# Altium footprint library MainFPs.PcbLib: 206 footprints (part 5 of 13)
Each footprint in its own frame and in the unit in brackets; x right, y up, seen from the top. Pads: shape width x height; smd on the part's side, far side on the other; paste and mask are expansions set on the pad; w line width, h text height; cw(c..) or ccw(c..) is an arc to the next point about the centre after c.
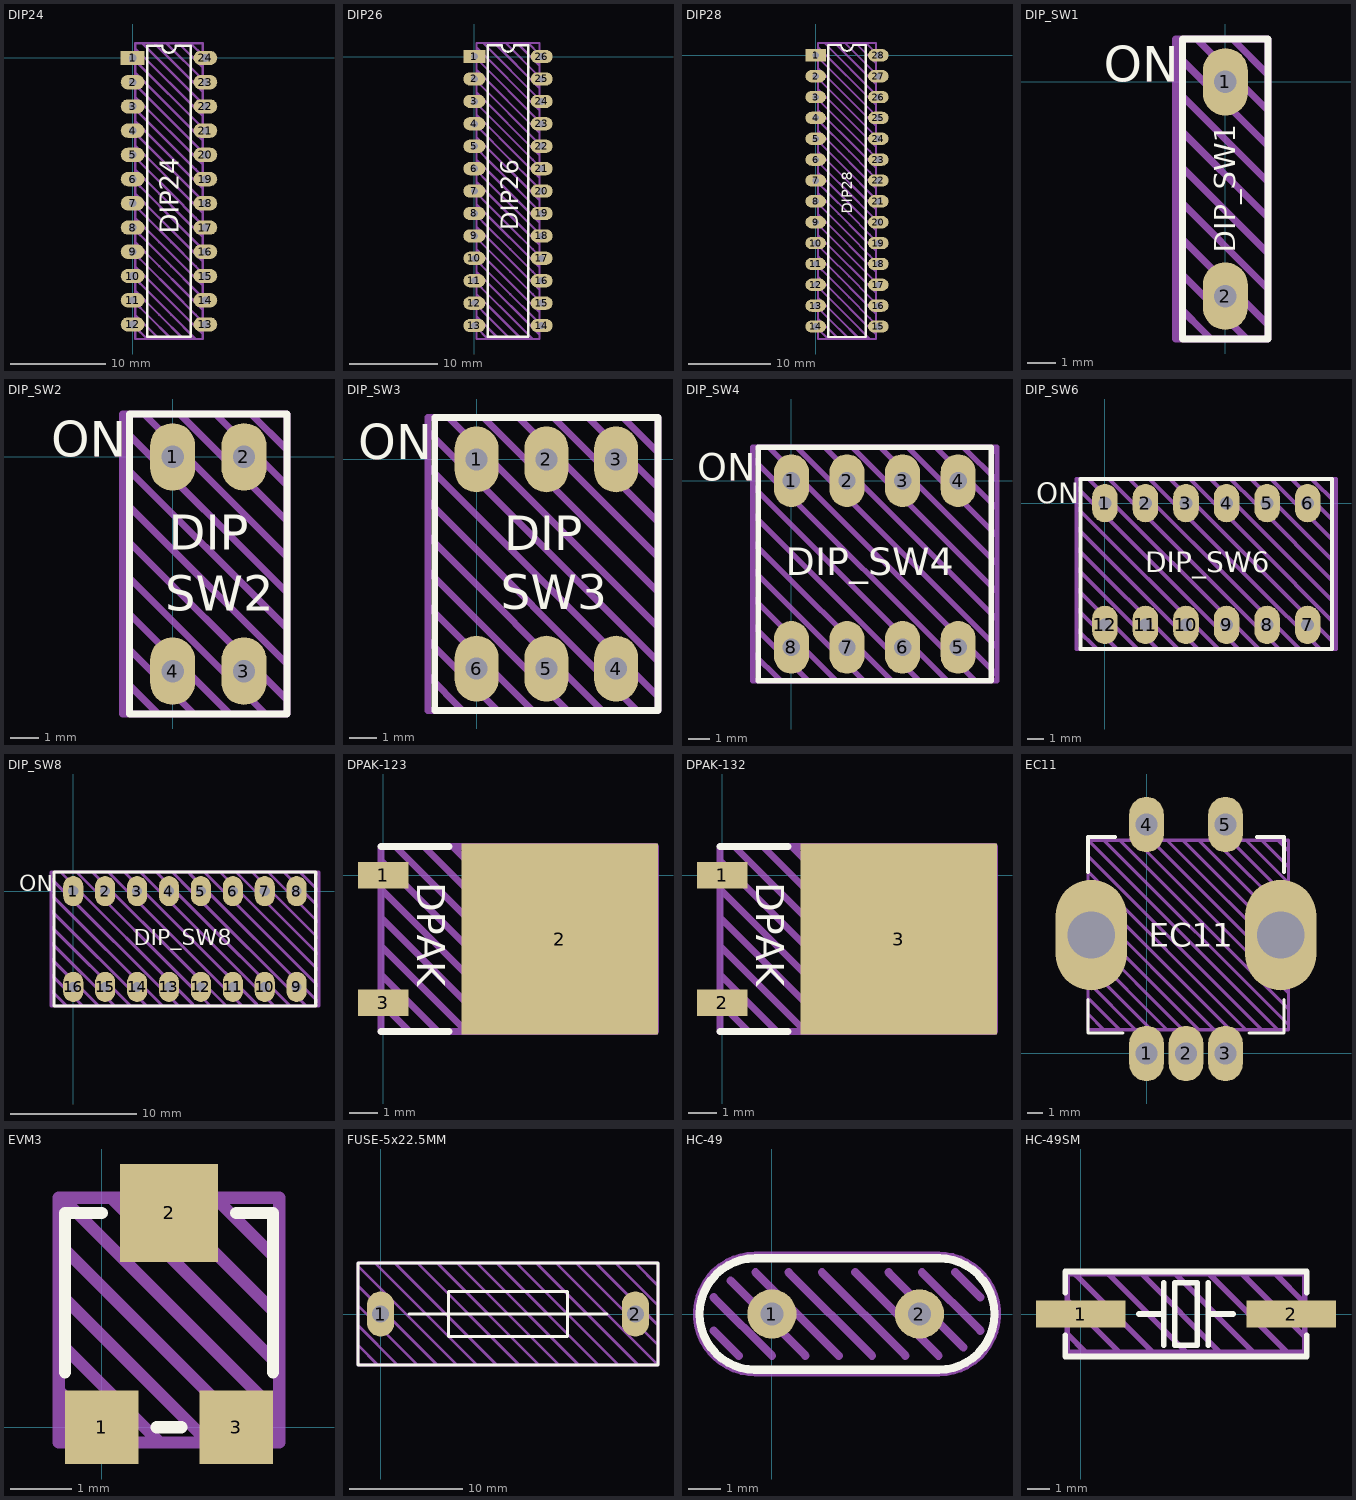
[diagram p4: the footprints below, top view; thin cyan lines are the x and y axes]

## DIP24 [mm]
pads (24):
  rect 2.5x1.5 hole 0.8: 1(0,0)
  oval 2.5x1.5 hole 0.8: 2(0,-2.54) 3(0,-5.08) 4(0,-7.62) 5(0,-10.16) 6(0,-12.7) 7(0,-15.24) 8(0,-17.78) 9(0,-20.32) 10(0,-22.86) 11(0,-25.4) 12(0,-27.94) 13(7.62,-27.94) 14(7.62,-25.4) 15(7.62,-22.86) 16(7.62,-20.32) 17(7.62,-17.78) 18(7.62,-15.24) 19(7.62,-12.7) 20(7.62,-10.16) 21(7.62,-7.62) 22(7.62,-5.08) 23(7.62,-2.54) 24(7.62,0)
Top Overlay:
  lines w0.25: 3.048,1.27 1.524,1.27 1.524,-29.21 6.096,-29.21 6.096,1.27 4.572,1.27 ; 3.092,1.27 ccw(c3.81,1.27) 4.528,1.27
  text "DIP24" at 4.826,-18.415 h2
Draw:
  lines w0.25: 0.254,-28.194 1.524,-29.464 ; 0.254,-26.924 2.794,-29.464 ; 0.254,-25.654 1.524,-26.924 4.064,-29.464 ; 0.254,-24.384 2.794,-26.924 5.334,-29.464 ; 0.254,-23.114 1.524,-24.384 4.064,-26.924 6.604,-29.464 ; 0.254,-21.844 2.794,-24.384 5.334,-26.924 7.366,-28.956 ; 0.254,-20.574 1.524,-21.844 4.064,-24.384 6.604,-26.924 7.366,-27.686 ; 0.254,-19.304 2.794,-21.844 5.334,-24.384 7.366,-26.416 ; 0.254,-18.034 1.524,-19.304 4.064,-21.844 6.604,-24.384 7.366,-25.146 ; 0.254,-16.764 2.794,-19.304 5.334,-21.844 7.366,-23.876 ; 0.254,-15.494 1.524,-16.764 4.064,-19.304 6.604,-21.844 7.366,-22.606 ; 0.254,-14.224 2.794,-16.764 5.334,-19.304 7.366,-21.336 ; 0.254,-12.954 1.524,-14.224 4.064,-16.764 6.604,-19.304 7.366,-20.066 ; 0.254,-11.684 2.794,-14.224 5.334,-16.764 7.366,-18.796 ; 0.254,-10.414 1.524,-11.684 ; 0.254,-9.144 2.794,-11.684 ; 0.254,-7.874 4.064,-11.684 6.604,-14.224 7.366,-14.986 ; 0.254,-6.604 5.334,-11.684 7.366,-13.716 ; 0.254,-5.334 6.604,-11.684 7.366,-12.446 ; 0.254,-4.064 7.366,-11.176 ; 0.254,-2.794 7.366,-9.906 ; 0.254,-1.524 7.366,-8.636 ; 0.254,-0.254 7.366,-7.366 ; 0.254,1.016 7.366,-6.096 ; 1.016,1.524 7.366,-4.826 ; 2.286,1.524 7.366,-3.556 ; 3.556,1.524 7.366,-2.286 ; 4.826,1.524 7.366,-1.016 ; 6.096,1.524 7.366,0.254 ; 7.366,-17.526 6.604,-16.764 4.064,-14.224 ; 7.366,-16.256 5.334,-14.224 ; 2.794,-11.684 5.334,-14.224 ; 2.794,-11.684 5.334,-14.224 ; 4.064,-14.224 1.27,-11.43 4.064,-14.224 ; 0.254,-29.464 7.366,-29.464 7.366,1.524 0.254,1.524 0.254,-29.464
Info:
  text "'.Comment'" at -0.381,-30.861 h1
3D body: height 0.38, standoff -3, extent 7.493,-20.574 7.747,-20.066
3D body: height 2.09, standoff 0.31, extent 7.112,-20.82 7.747,-19.82
3D body: height 0.38, standoff -3, extent 7.493,-23.114 7.747,-22.606
3D body: height 2.09, standoff 0.31, extent 7.112,-23.36 7.747,-22.36
3D body: height 0.38, standoff -3, extent -0.127,-23.114 0.127,-22.606
3D body: height 2.09, standoff 0.31, extent -0.127,-23.36 0.508,-22.36
3D body: height 0.38, standoff -3, extent -0.127,-20.574 0.127,-20.066
3D body: height 2.09, standoff 0.31, extent -0.127,-20.82 0.508,-19.82
3D body: height 0.38, standoff -3, extent 7.493,-25.654 7.747,-25.146
3D body: height 2.09, standoff 0.31, extent 7.112,-25.9 7.747,-24.9
3D body: height 0.38, standoff -3, extent 7.493,-28.194 7.747,-27.686
3D body: height 2.09, standoff 0.31, extent 7.112,-28.44 7.747,-27.44
3D body: height 0.38, standoff -3, extent -0.127,-28.194 0.127,-27.686
3D body: height 2.09, standoff 0.31, extent -0.127,-28.44 0.508,-27.44
3D body: height 0.38, standoff -3, extent -0.127,-25.654 0.127,-25.146
3D body: height 2.09, standoff 0.31, extent -0.127,-25.9 0.508,-24.9
3D body: height 0.38, standoff -3, extent 7.493,-10.414 7.747,-9.906
3D body: height 2.09, standoff 0.31, extent 7.112,-10.66 7.747,-9.66
3D body: height 0.38, standoff -3, extent 7.493,-12.954 7.747,-12.446
3D body: height 2.09, standoff 0.31, extent 7.112,-13.2 7.747,-12.2
3D body: height 0.38, standoff -3, extent -0.127,-12.954 0.127,-12.446
3D body: height 2.09, standoff 0.31, extent -0.127,-13.2 0.508,-12.2
3D body: height 0.38, standoff -3, extent -0.127,-10.414 0.127,-9.906
3D body: height 2.09, standoff 0.31, extent -0.127,-10.66 0.508,-9.66
3D body: height 0.38, standoff -3, extent 7.493,-15.494 7.747,-14.986
3D body: height 2.09, standoff 0.31, extent 7.112,-15.74 7.747,-14.74
3D body: height 0.38, standoff -3, extent 7.493,-18.034 7.747,-17.526
3D body: height 2.09, standoff 0.31, extent 7.112,-18.28 7.747,-17.28
3D body: height 0.38, standoff -3, extent -0.127,-18.034 0.127,-17.526
3D body: height 2.09, standoff 0.31, extent -0.127,-18.28 0.508,-17.28
3D body: height 0.38, standoff -3, extent -0.127,-15.494 0.127,-14.986
3D body: height 2.09, standoff 0.31, extent -0.127,-15.74 0.508,-14.74
3D body: height 0.38, standoff -3, extent 7.493,-0.254 7.747,0.254
3D body: height 2.09, standoff 0.31, extent 7.112,-0.5 7.747,0.5
3D body: height 0.38, standoff -3, extent 7.493,-2.794 7.747,-2.286
3D body: height 2.09, standoff 0.31, extent 7.112,-3.04 7.747,-2.04
3D body: height 0.38, standoff -3, extent -0.127,-2.794 0.127,-2.286
3D body: height 2.09, standoff 0.31, extent -0.127,-3.04 0.508,-2.04
3D body: height 0.38, standoff -3, extent -0.127,-0.254 0.127,0.254
3D body: height 2.09, standoff 0.31, extent -0.127,-0.5 0.508,0.5
3D body: height 0.38, standoff -3, extent 7.493,-5.334 7.747,-4.826
3D body: height 2.09, standoff 0.31, extent 7.112,-5.58 7.747,-4.58
3D body: height 0.38, standoff -3, extent 7.493,-7.874 7.747,-7.366
3D body: height 2.09, standoff 0.31, extent 7.112,-8.12 7.747,-7.12
3D body: height 0.38, standoff -3, extent -0.127,-7.874 0.127,-7.366
3D body: height 2.09, standoff 0.31, extent -0.127,-8.12 0.508,-7.12
3D body: height 0.38, standoff -3, extent -0.127,-5.334 0.127,-4.826
3D body: height 2.09, standoff 0.31, extent -0.127,-5.58 0.508,-4.58
3D body: height 3, standoff 2, extent 0.508,-29.21 7.112,1.27
3D body: height 2.03, standoff 0.25, extent 0.508,-29.21 7.112,1.27

## DIP26 [mm]
pads (26):
  rect 2.5x1.5 hole 0.8: 1(0,0)
  oval 2.5x1.5 hole 0.8: 2(0,-2.54) 3(0,-5.08) 4(0,-7.62) 5(0,-10.16) 6(0,-12.7) 7(0,-15.24) 8(0,-17.78) 9(0,-20.32) 10(0,-22.86) 11(0,-25.4) 12(0,-27.94) 13(0,-30.48) 14(7.62,-30.48) 15(7.62,-27.94) 16(7.62,-25.4) 17(7.62,-22.86) 18(7.62,-20.32) 19(7.62,-17.78) 20(7.62,-15.24) 21(7.62,-12.7) 22(7.62,-10.16) 23(7.62,-7.62) 24(7.62,-5.08) 25(7.62,-2.54) 26(7.62,0)
Top Overlay:
  lines w0.25: 3.048,1.27 1.524,1.27 1.524,-31.75 6.096,-31.75 6.096,1.27 4.572,1.27 ; 3.092,1.27 ccw(c3.81,1.27) 4.528,1.27
  text "DIP26" at 4.953,-19.685 h2
Draw:
  lines w0.25: 0.254,-30.734 1.524,-32.004 ; 0.254,-29.464 2.794,-32.004 ; 0.254,-28.194 1.524,-29.464 4.064,-32.004 ; 0.254,-26.924 2.794,-29.464 5.334,-32.004 ; 0.254,-25.654 1.524,-26.924 4.064,-29.464 6.604,-32.004 ; 0.254,-24.384 2.794,-26.924 5.334,-29.464 7.366,-31.496 ; 0.254,-23.114 1.524,-24.384 4.064,-26.924 6.604,-29.464 7.366,-30.226 ; 0.254,-21.844 2.794,-24.384 5.334,-26.924 7.366,-28.956 ; 0.254,-20.574 1.524,-21.844 4.064,-24.384 6.604,-26.924 7.366,-27.686 ; 0.254,-19.304 2.794,-21.844 5.334,-24.384 7.366,-26.416 ; 0.254,-18.034 1.524,-19.304 4.064,-21.844 6.604,-24.384 7.366,-25.146 ; 0.254,-16.764 2.794,-19.304 5.334,-21.844 7.366,-23.876 ; 0.254,-15.494 1.524,-16.764 4.064,-19.304 6.604,-21.844 7.366,-22.606 ; 0.254,-14.224 2.794,-16.764 5.334,-19.304 7.366,-21.336 ; 0.254,-12.954 1.524,-14.224 4.064,-16.764 6.604,-19.304 7.366,-20.066 ; 0.254,-11.684 2.794,-14.224 5.334,-16.764 7.366,-18.796 ; 0.254,-10.414 1.524,-11.684 ; 0.254,-9.144 2.794,-11.684 ; 0.254,-7.874 4.064,-11.684 6.604,-14.224 7.366,-14.986 ; 0.254,-6.604 5.334,-11.684 7.366,-13.716 ; 0.254,-5.334 6.604,-11.684 7.366,-12.446 ; 0.254,-4.064 7.366,-11.176 ; 0.254,-2.794 7.366,-9.906 ; 0.254,-1.524 7.366,-8.636 ; 0.254,-0.254 7.366,-7.366 ; 0.254,1.016 7.366,-6.096 ; 1.016,1.524 7.366,-4.826 ; 2.286,1.524 7.366,-3.556 ; 3.556,1.524 7.366,-2.286 ; 4.826,1.524 7.366,-1.016 ; 6.096,1.524 7.366,0.254 ; 7.366,-17.526 6.604,-16.764 4.064,-14.224 ; 7.366,-16.256 5.334,-14.224 ; 2.794,-11.684 5.334,-14.224 ; 2.794,-11.684 5.334,-14.224 ; 4.064,-14.224 1.27,-11.43 4.064,-14.224 ; 0.254,-32.004 7.366,-32.004 7.366,1.27 7.366,1.524 0.254,1.524 0.254,-32.004
Info:
  text "'.Comment'" at -0.381,-33.401 h1
3D body: height 3, standoff 2, extent 0.508,-31.75 7.112,1.27
3D body: height 2.03, standoff 0.25, extent 0.508,-31.75 7.112,1.27
3D body: height 2.09, standoff 0.31, extent -0.127,-5.58 0.508,-4.58
3D body: height 0.38, standoff -3, extent -0.127,-5.334 0.127,-4.826
3D body: height 2.09, standoff 0.31, extent -0.127,-8.12 0.508,-7.12
3D body: height 0.38, standoff -3, extent -0.127,-7.874 0.127,-7.366
3D body: height 2.09, standoff 0.31, extent 7.112,-8.12 7.747,-7.12
3D body: height 0.38, standoff -3, extent 7.493,-7.874 7.747,-7.366
3D body: height 2.09, standoff 0.31, extent 7.112,-5.58 7.747,-4.58
3D body: height 0.38, standoff -3, extent 7.493,-5.334 7.747,-4.826
3D body: height 2.09, standoff 0.31, extent -0.127,-0.5 0.508,0.5
3D body: height 0.38, standoff -3, extent -0.127,-0.254 0.127,0.254
3D body: height 2.09, standoff 0.31, extent -0.127,-3.04 0.508,-2.04
3D body: height 0.38, standoff -3, extent -0.127,-2.794 0.127,-2.286
3D body: height 2.09, standoff 0.31, extent 7.112,-3.04 7.747,-2.04
3D body: height 0.38, standoff -3, extent 7.493,-2.794 7.747,-2.286
3D body: height 2.09, standoff 0.31, extent 7.112,-0.5 7.747,0.5
3D body: height 0.38, standoff -3, extent 7.493,-0.254 7.747,0.254
3D body: height 2.09, standoff 0.31, extent -0.127,-15.74 0.508,-14.74
3D body: height 0.38, standoff -3, extent -0.127,-15.494 0.127,-14.986
3D body: height 2.09, standoff 0.31, extent -0.127,-18.28 0.508,-17.28
3D body: height 0.38, standoff -3, extent -0.127,-18.034 0.127,-17.526
3D body: height 2.09, standoff 0.31, extent 7.112,-18.28 7.747,-17.28
3D body: height 0.38, standoff -3, extent 7.493,-18.034 7.747,-17.526
3D body: height 2.09, standoff 0.31, extent 7.112,-15.74 7.747,-14.74
3D body: height 0.38, standoff -3, extent 7.493,-15.494 7.747,-14.986
3D body: height 2.09, standoff 0.31, extent -0.127,-10.66 0.508,-9.66
3D body: height 0.38, standoff -3, extent -0.127,-10.414 0.127,-9.906
3D body: height 2.09, standoff 0.31, extent -0.127,-13.2 0.508,-12.2
3D body: height 0.38, standoff -3, extent -0.127,-12.954 0.127,-12.446
3D body: height 2.09, standoff 0.31, extent 7.112,-13.2 7.747,-12.2
3D body: height 0.38, standoff -3, extent 7.493,-12.954 7.747,-12.446
3D body: height 2.09, standoff 0.31, extent 7.112,-10.66 7.747,-9.66
3D body: height 0.38, standoff -3, extent 7.493,-10.414 7.747,-9.906
3D body: height 2.09, standoff 0.31, extent -0.127,-25.9 0.508,-24.9
3D body: height 0.38, standoff -3, extent -0.127,-25.654 0.127,-25.146
3D body: height 2.09, standoff 0.31, extent -0.127,-28.44 0.508,-27.44
3D body: height 0.38, standoff -3, extent -0.127,-28.194 0.127,-27.686
3D body: height 2.09, standoff 0.31, extent 7.112,-28.44 7.747,-27.44
3D body: height 0.38, standoff -3, extent 7.493,-28.194 7.747,-27.686
3D body: height 2.09, standoff 0.31, extent 7.112,-25.9 7.747,-24.9
3D body: height 0.38, standoff -3, extent 7.493,-25.654 7.747,-25.146
3D body: height 2.09, standoff 0.31, extent -0.127,-20.82 0.508,-19.82
3D body: height 0.38, standoff -3, extent -0.127,-20.574 0.127,-20.066
3D body: height 2.09, standoff 0.31, extent -0.127,-23.36 0.508,-22.36
3D body: height 0.38, standoff -3, extent -0.127,-23.114 0.127,-22.606
3D body: height 2.09, standoff 0.31, extent 7.112,-23.36 7.747,-22.36
3D body: height 0.38, standoff -3, extent 7.493,-23.114 7.747,-22.606
3D body: height 2.09, standoff 0.31, extent 7.112,-20.82 7.747,-19.82
3D body: height 0.38, standoff -3, extent 7.493,-20.574 7.747,-20.066
3D body: height 2.09, standoff 0.31, extent -0.127,-30.98 0.508,-29.98
3D body: height 0.38, standoff -3, extent -0.127,-30.734 0.127,-30.226
3D body: height 2.09, standoff 0.31, extent 7.112,-30.98 7.747,-29.98
3D body: height 0.38, standoff -3, extent 7.493,-30.734 7.747,-30.226

## DIP28 [mm]
pads (28):
  rect 2.5x1.5 hole 0.8: 1(0,0)
  oval 2.5x1.5 hole 0.8: 2(0,-2.54) 3(0,-5.08) 4(0,-7.62) 5(0,-10.16) 6(0,-12.7) 7(0,-15.24) 8(0,-17.78) 9(0,-20.32) 10(0,-22.86) 11(0,-25.4) 12(0,-27.94) 13(0,-30.48) 14(0,-33.02) 15(7.62,-33.02) 16(7.62,-30.48) 17(7.62,-27.94) 18(7.62,-25.4) 19(7.62,-22.86) 20(7.62,-20.32) 21(7.62,-17.78) 22(7.62,-15.24) 23(7.62,-12.7) 24(7.62,-10.16) 25(7.62,-7.62) 26(7.62,-5.08) 27(7.62,-2.54) 28(7.62,0)
Top Overlay:
  lines w0.25: 3.048,1.27 1.524,1.27 1.524,-34.29 6.096,-34.29 6.096,1.27 4.572,1.27 ; 3.092,1.27 ccw(c3.81,1.27) 4.528,1.27
  text "DIP28" at 4.445,-19.304 h1.27
Draw:
  lines w0.25: 0.254,-33.274 1.524,-34.544 ; 0.254,-32.004 2.794,-34.544 ; 0.254,-30.734 1.524,-32.004 4.064,-34.544 ; 0.254,-29.464 2.794,-32.004 5.334,-34.544 ; 0.254,-28.194 1.524,-29.464 4.064,-32.004 6.604,-34.544 ; 0.254,-26.924 2.794,-29.464 5.334,-32.004 7.366,-34.036 ; 0.254,-25.654 1.524,-26.924 4.064,-29.464 6.604,-32.004 7.366,-32.766 ; 0.254,-24.384 2.794,-26.924 5.334,-29.464 7.366,-31.496 ; 0.254,-23.114 1.524,-24.384 4.064,-26.924 6.604,-29.464 7.366,-30.226 ; 0.254,-21.844 2.794,-24.384 5.334,-26.924 7.366,-28.956 ; 0.254,-20.574 1.524,-21.844 4.064,-24.384 6.604,-26.924 7.366,-27.686 ; 0.254,-19.304 2.794,-21.844 5.334,-24.384 7.366,-26.416 ; 0.254,-18.034 1.524,-19.304 4.064,-21.844 6.604,-24.384 7.366,-25.146 ; 0.254,-16.764 2.794,-19.304 5.334,-21.844 7.366,-23.876 ; 0.254,-15.494 1.524,-16.764 4.064,-19.304 6.604,-21.844 7.366,-22.606 ; 0.254,-14.224 2.794,-16.764 5.334,-19.304 7.366,-21.336 ; 0.254,-12.954 1.524,-14.224 4.064,-16.764 6.604,-19.304 7.366,-20.066 ; 0.254,-11.684 2.794,-14.224 5.334,-16.764 7.366,-18.796 ; 0.254,-10.414 1.524,-11.684 ; 0.254,-9.144 2.794,-11.684 ; 0.254,-7.874 4.064,-11.684 6.604,-14.224 7.366,-14.986 ; 0.254,-6.604 5.334,-11.684 7.366,-13.716 ; 0.254,-5.334 6.604,-11.684 7.366,-12.446 ; 0.254,-4.064 7.366,-11.176 ; 0.254,-2.794 7.366,-9.906 ; 0.254,-1.524 7.366,-8.636 ; 0.254,-0.254 7.366,-7.366 ; 0.254,1.016 7.366,-6.096 ; 1.016,1.524 7.366,-4.826 ; 2.286,1.524 7.366,-3.556 ; 3.556,1.524 7.366,-2.286 ; 4.826,1.524 7.366,-1.016 ; 6.096,1.524 7.366,0.254 ; 7.366,-17.526 6.604,-16.764 4.064,-14.224 ; 7.366,-16.256 5.334,-14.224 ; 2.794,-11.684 5.334,-14.224 ; 2.794,-11.684 5.334,-14.224 ; 4.064,-14.224 1.27,-11.43 4.064,-14.224 ; 0.254,-34.544 7.366,-34.544 7.366,1.524 0.254,1.524 0.254,-34.544
Info:
  text "'.Comment'" at -0.381,-35.941 h1
3D body: height 0.38, standoff -3, extent 7.493,-30.734 7.747,-30.226
3D body: height 2.09, standoff 0.31, extent 7.112,-30.98 7.747,-29.98
3D body: height 0.38, standoff -3, extent 7.493,-33.274 7.747,-32.766
3D body: height 2.09, standoff 0.31, extent 7.112,-33.52 7.747,-32.52
3D body: height 0.38, standoff -3, extent -0.127,-33.274 0.127,-32.766
3D body: height 2.09, standoff 0.31, extent -0.127,-33.52 0.508,-32.52
3D body: height 0.38, standoff -3, extent -0.127,-30.734 0.127,-30.226
3D body: height 2.09, standoff 0.31, extent -0.127,-30.98 0.508,-29.98
3D body: height 0.38, standoff -3, extent 7.493,-20.574 7.747,-20.066
3D body: height 2.09, standoff 0.31, extent 7.112,-20.82 7.747,-19.82
3D body: height 0.38, standoff -3, extent 7.493,-23.114 7.747,-22.606
3D body: height 2.09, standoff 0.31, extent 7.112,-23.36 7.747,-22.36
3D body: height 0.38, standoff -3, extent -0.127,-23.114 0.127,-22.606
3D body: height 2.09, standoff 0.31, extent -0.127,-23.36 0.508,-22.36
3D body: height 0.38, standoff -3, extent -0.127,-20.574 0.127,-20.066
3D body: height 2.09, standoff 0.31, extent -0.127,-20.82 0.508,-19.82
3D body: height 0.38, standoff -3, extent 7.493,-25.654 7.747,-25.146
3D body: height 2.09, standoff 0.31, extent 7.112,-25.9 7.747,-24.9
3D body: height 0.38, standoff -3, extent 7.493,-28.194 7.747,-27.686
3D body: height 2.09, standoff 0.31, extent 7.112,-28.44 7.747,-27.44
3D body: height 0.38, standoff -3, extent -0.127,-28.194 0.127,-27.686
3D body: height 2.09, standoff 0.31, extent -0.127,-28.44 0.508,-27.44
3D body: height 0.38, standoff -3, extent -0.127,-25.654 0.127,-25.146
3D body: height 2.09, standoff 0.31, extent -0.127,-25.9 0.508,-24.9
3D body: height 0.38, standoff -3, extent 7.493,-10.414 7.747,-9.906
3D body: height 2.09, standoff 0.31, extent 7.112,-10.66 7.747,-9.66
3D body: height 0.38, standoff -3, extent 7.493,-12.954 7.747,-12.446
3D body: height 2.09, standoff 0.31, extent 7.112,-13.2 7.747,-12.2
3D body: height 0.38, standoff -3, extent -0.127,-12.954 0.127,-12.446
3D body: height 2.09, standoff 0.31, extent -0.127,-13.2 0.508,-12.2
3D body: height 0.38, standoff -3, extent -0.127,-10.414 0.127,-9.906
3D body: height 2.09, standoff 0.31, extent -0.127,-10.66 0.508,-9.66
3D body: height 0.38, standoff -3, extent 7.493,-15.494 7.747,-14.986
3D body: height 2.09, standoff 0.31, extent 7.112,-15.74 7.747,-14.74
3D body: height 0.38, standoff -3, extent 7.493,-18.034 7.747,-17.526
3D body: height 2.09, standoff 0.31, extent 7.112,-18.28 7.747,-17.28
3D body: height 0.38, standoff -3, extent -0.127,-18.034 0.127,-17.526
3D body: height 2.09, standoff 0.31, extent -0.127,-18.28 0.508,-17.28
3D body: height 0.38, standoff -3, extent -0.127,-15.494 0.127,-14.986
3D body: height 2.09, standoff 0.31, extent -0.127,-15.74 0.508,-14.74
3D body: height 0.38, standoff -3, extent 7.493,-0.254 7.747,0.254
3D body: height 2.09, standoff 0.31, extent 7.112,-0.5 7.747,0.5
3D body: height 0.38, standoff -3, extent 7.493,-2.794 7.747,-2.286
3D body: height 2.09, standoff 0.31, extent 7.112,-3.04 7.747,-2.04
3D body: height 0.38, standoff -3, extent -0.127,-2.794 0.127,-2.286
3D body: height 2.09, standoff 0.31, extent -0.127,-3.04 0.508,-2.04
3D body: height 0.38, standoff -3, extent -0.127,-0.254 0.127,0.254
3D body: height 2.09, standoff 0.31, extent -0.127,-0.5 0.508,0.5
3D body: height 0.38, standoff -3, extent 7.493,-5.334 7.747,-4.826
3D body: height 2.09, standoff 0.31, extent 7.112,-5.58 7.747,-4.58
3D body: height 0.38, standoff -3, extent 7.493,-7.874 7.747,-7.366
3D body: height 2.09, standoff 0.31, extent 7.112,-8.12 7.747,-7.12
3D body: height 0.38, standoff -3, extent -0.127,-7.874 0.127,-7.366
3D body: height 2.09, standoff 0.31, extent -0.127,-8.12 0.508,-7.12
3D body: height 0.38, standoff -3, extent -0.127,-5.334 0.127,-4.826
3D body: height 2.09, standoff 0.31, extent -0.127,-5.58 0.508,-4.58
3D body: height 2.03, standoff 0.25, extent 0.508,-34.29 7.112,1.27
3D body: height 3, standoff 2, extent 0.508,-34.29 7.112,1.27

## DIP_SW1 [mm]
pads (2):
  oval 1.6x2.4 hole 0.8: 1(0,0) 2(0,-7.62)
Top Overlay:
  lines w0.25: -1.524,-9.144 -1.524,1.524 1.524,1.524 1.524,-9.144 -1.524,-9.144
  text "DIP_SW1" at 0.36,-6.073 h0.75
  text "ON" at -4.318,0 h1.27
Draw:
  lines w0.25: -1.778,-7.874 -0.508,-9.144 ; -1.778,-6.604 0.762,-9.144 ; -1.778,-5.334 1.524,-8.636 ; -1.778,-4.064 1.524,-7.366 ; -1.778,-2.794 1.524,-6.096 ; -1.778,-1.524 1.524,-4.826 ; -1.778,-0.254 1.524,-3.556 ; -1.778,1.016 1.524,-2.286 ; -1.016,1.524 1.524,-1.016 ; 0.254,1.524 1.524,0.254 ; -1.778,-9.144 1.524,-9.144 1.524,1.524 -1.778,1.524 -1.778,-9.144
Info:
  text "'.Comment'" at -1.778,-10.922 h1.25
3D body: height 7.62, standoff 6.32, extent -0.762,-3.302 0.762,-2.032
3D body: height 6.86, standoff 6.32, extent 0.762,-5.588 1.524,-2.032
3D body: height 6.86, standoff 6.32, extent -1.524,-5.588 -0.762,-2.032
3D body: height 0.25, standoff -1.78, extent -0.254,-0.127 0.254,0.127
3D body: height 0.25, standoff -1.78, extent -0.254,-7.747 0.254,-7.493
3D body: height 6.35, standoff 0, extent -1.778,-9.144 1.524,1.524
3D body: height 6.86, standoff 0.25, extent -1.778,-2.032 1.524,1.524
3D body: height 6.86, standoff 0.25, extent -1.778,-9.144 1.524,-5.588
3D body: height 6.43, standoff 6.32, extent -0.762,-5.588 0.762,-2.032

## DIP_SW2 [mm]
pads (4):
  oval 1.6x2.4 hole 0.8: 1(0,0) 2(2.54,0) 3(2.54,-7.62) 4(0,-7.62)
Top Overlay:
  lines w0.25: -1.524,-9.144 -1.524,1.524 4.064,1.524 4.064,-9.144 -1.524,-9.144
  text "SW2" at -0.258,-5.465 h1.25
  text "DIP" at -0.131,-3.306 h1.25
  text "ON" at -4.318,0 h1.27
Draw:
  lines w0.25: -1.778,-7.874 -0.508,-9.144 ; -1.778,-6.604 0.762,-9.144 ; -1.778,-5.334 2.032,-9.144 ; -1.778,-4.064 3.302,-9.144 ; -1.778,-2.794 4.064,-8.636 ; -1.778,-1.524 4.064,-7.366 ; -1.778,-0.254 4.064,-6.096 ; -1.778,1.016 4.064,-4.826 ; -1.016,1.524 4.064,-3.556 ; 0.254,1.524 4.064,-2.286 ; 1.524,1.524 4.064,-1.016 ; 2.794,1.524 4.064,0.254 ; -1.778,-9.144 4.064,-9.144 4.064,1.524 -1.778,1.524 -1.778,-9.144
Info:
  text "'.Comment'" at -1.778,-10.922 h1.25
3D body: height 7.62, standoff 6.32, extent -0.762,-3.302 0.762,-2.032
3D body: height 6.86, standoff 6.32, extent 0.762,-5.588 1.778,-2.032
3D body: height 6.86, standoff 6.32, extent -1.524,-5.588 -0.762,-2.032
3D body: height 0.25, standoff -1.78, extent 2.286,-0.127 2.794,0.127
3D body: height 0.25, standoff -1.78, extent -0.254,-0.127 0.254,0.127
3D body: height 0.25, standoff -1.78, extent 2.286,-7.747 2.794,-7.493
3D body: height 0.25, standoff -1.78, extent -0.254,-7.747 0.254,-7.493
3D body: height 6.35, standoff 0, extent -1.778,-9.144 4.064,1.524
3D body: height 6.86, standoff 0.25, extent -1.778,-2.032 4.064,1.524
3D body: height 6.86, standoff 0.25, extent -1.778,-9.144 4.064,-5.588
3D body: height 6.86, standoff 6.32, extent 3.302,-5.588 4.064,-2.032
3D body: height 6.43, standoff 6.32, extent -0.762,-5.588 0.762,-2.032
3D body: height 6.43, standoff 6.32, extent 1.778,-5.588 3.302,-2.032
3D body: height 7.62, standoff 6.32, extent 1.778,-3.302 3.302,-2.032

## DIP_SW3 [mm]
pads (6):
  oval 1.6x2.4 hole 0.8: 1(0,0) 2(2.54,0) 3(5.08,0) 4(5.08,-7.62) 5(2.54,-7.62) 6(0,-7.62)
Top Overlay:
  lines w0.25: -1.524,-9.144 -1.524,1.524 6.604,1.524 6.604,-9.144 -1.524,-9.144
  text "SW3" at 0.885,-5.465 h1.25
  text "DIP" at 1.012,-3.306 h1.25
  text "ON" at -4.318,0 h1.27
Draw:
  lines w0.25: -1.778,-7.874 -0.508,-9.144 ; -1.778,-6.604 0.762,-9.144 ; -1.778,-5.334 2.032,-9.144 ; -1.778,-4.064 3.302,-9.144 ; -1.778,-2.794 4.572,-9.144 ; -1.778,-1.524 5.842,-9.144 ; -1.778,-0.254 6.604,-8.636 ; -1.778,1.016 6.604,-7.366 ; -1.016,1.524 6.604,-6.096 ; 0.254,1.524 6.604,-4.826 ; 1.524,1.524 6.604,-3.556 ; 2.794,1.524 6.604,-2.286 ; 4.064,1.524 6.604,-1.016 ; 5.334,1.524 6.604,0.254 ; -1.778,-9.144 6.604,-9.144 6.604,1.524 -1.778,1.524 -1.778,-9.144
Info:
  text "'.Comment'" at -1.778,-10.922 h1.25
3D body: height 7.62, standoff 6.32, extent -0.762,-3.302 0.762,-2.032
3D body: height 6.86, standoff 6.32, extent 0.762,-5.588 1.778,-2.032
3D body: height 6.86, standoff 6.32, extent -1.524,-5.588 -0.762,-2.032
3D body: height 0.25, standoff -1.78, extent 4.826,-0.127 5.334,0.127
3D body: height 0.25, standoff -1.78, extent 2.286,-0.127 2.794,0.127
3D body: height 0.25, standoff -1.78, extent -0.254,-0.127 0.254,0.127
3D body: height 0.25, standoff -1.78, extent 4.826,-7.747 5.334,-7.493
3D body: height 0.25, standoff -1.78, extent 2.286,-7.747 2.794,-7.493
3D body: height 0.25, standoff -1.78, extent -0.254,-7.747 0.254,-7.493
3D body: height 6.35, standoff 0, extent -1.778,-9.144 6.604,1.524
3D body: height 6.86, standoff 0.25, extent -1.778,-2.032 6.604,1.524
3D body: height 6.86, standoff 0.25, extent -1.778,-9.144 6.604,-5.588
3D body: height 6.86, standoff 6.32, extent 3.302,-5.588 4.318,-2.032
3D body: height 6.86, standoff 6.32, extent 5.842,-5.588 6.604,-2.032
3D body: height 6.43, standoff 6.32, extent -0.762,-5.588 0.762,-2.032
3D body: height 6.43, standoff 6.32, extent 1.778,-5.588 3.302,-2.032
3D body: height 7.62, standoff 6.32, extent 1.778,-3.302 3.302,-2.032
3D body: height 6.43, standoff 6.32, extent 4.318,-5.588 5.842,-2.032
3D body: height 7.62, standoff 6.32, extent 4.318,-3.302 5.842,-2.032

## DIP_SW4 [mm]
pads (8):
  oval 1.6x2.4 hole 0.8: 1(0,0) 2(2.54,0) 3(5.08,0) 4(7.62,0) 5(7.62,-7.62) 6(5.08,-7.62) 7(2.54,-7.62) 8(0,-7.62)
Top Overlay:
  lines w0.25: -1.524,-9.144 9.144,-9.144 9.144,1.524 -1.524,1.524 -1.524,-9.144
  text "ON" at -4.318,0 h1.27
  text "DIP_SW4" at -0.254,-4.318 h1.27
Draw:
  lines w0.25: -1.778,-7.874 -0.508,-9.144 ; -1.778,-6.604 0.762,-9.144 ; -1.778,-5.334 2.032,-9.144 ; -1.778,-4.064 3.302,-9.144 ; -1.778,-2.794 4.572,-9.144 ; -1.778,-1.524 5.842,-9.144 ; -1.778,-0.254 7.112,-9.144 ; -1.778,1.016 8.382,-9.144 ; -1.016,1.524 9.398,-8.89 ; 0.254,1.524 9.398,-7.62 ; 1.524,1.524 9.398,-6.35 ; 2.794,1.524 9.398,-5.08 ; 4.064,1.524 9.398,-3.81 ; 5.334,1.524 9.398,-2.54 ; 6.604,1.524 9.398,-1.27 ; 7.874,1.524 9.398,0 ; 9.144,1.524 9.398,1.27 ; -1.778,-9.144 -1.778,1.524 9.398,1.524 9.398,-9.144 -1.778,-9.144
Info:
  text "'.Comment'" at -1.778,-10.922 h1.25
3D body: height 7.62, standoff 6.32, extent 6.858,-3.302 8.382,-2.032
3D body: height 6.43, standoff 6.32, extent 6.858,-5.588 8.382,-2.032
3D body: height 7.62, standoff 6.32, extent 4.318,-3.302 5.842,-2.032
3D body: height 6.43, standoff 6.32, extent 4.318,-5.588 5.842,-2.032
3D body: height 7.62, standoff 6.32, extent 1.778,-3.302 3.302,-2.032
3D body: height 6.43, standoff 6.32, extent 1.778,-5.588 3.302,-2.032
3D body: height 6.43, standoff 6.32, extent -0.762,-5.588 0.762,-2.032
3D body: height 6.86, standoff 6.32, extent 8.382,-5.588 9.398,-2.032
3D body: height 6.86, standoff 6.32, extent 5.842,-5.588 6.858,-2.032
3D body: height 6.86, standoff 6.32, extent 3.302,-5.588 4.318,-2.032
3D body: height 6.86, standoff 0.25, extent -1.778,-9.144 9.398,-5.588
3D body: height 6.86, standoff 0.25, extent -1.778,-2.032 9.398,1.524
3D body: height 6.35, standoff 0, extent -1.778,-9.144 9.398,1.524
3D body: height 0.25, standoff -1.78, extent -0.254,-7.747 0.254,-7.493
3D body: height 0.25, standoff -1.78, extent 2.286,-7.747 2.794,-7.493
3D body: height 0.25, standoff -1.78, extent 4.826,-7.747 5.334,-7.493
3D body: height 0.25, standoff -1.78, extent -0.254,-0.127 0.254,0.127
3D body: height 0.25, standoff -1.78, extent 2.286,-0.127 2.794,0.127
3D body: height 0.25, standoff -1.78, extent 4.826,-0.127 5.334,0.127
3D body: height 0.25, standoff -1.78, extent 7.366,-0.127 7.874,0.127
3D body: height 0.25, standoff -1.78, extent 7.366,-7.747 7.874,-7.493
3D body: height 6.86, standoff 6.32, extent -1.524,-5.588 -0.762,-2.032
3D body: height 6.86, standoff 6.32, extent 0.762,-5.588 1.778,-2.032
3D body: height 7.62, standoff 6.32, extent -0.762,-3.302 0.762,-2.032

## DIP_SW6 [mm]
pads (12):
  oval 1.6x2.4 hole 0.8: 1(0,0) 2(2.54,0) 3(5.08,0) 4(7.62,0) 5(10.16,0) 6(12.7,0) 7(12.7,-7.62) 8(10.16,-7.62) 9(7.62,-7.62) 10(5.08,-7.62) 11(2.54,-7.62) 12(0,-7.62)
Top Overlay:
  lines w0.25: -1.524,-9.144 14.224,-9.144 14.224,1.524 -1.524,1.524 -1.524,-9.144
  text "ON" at -4.318,0 h1.27
  text "DIP_SW6" at 2.54,-4.318 h1.27
Draw:
  lines w0.25: -1.778,-7.874 -0.508,-9.144 ; -1.778,-6.604 0.762,-9.144 ; -1.778,-5.334 2.032,-9.144 ; -1.778,-4.064 3.302,-9.144 ; -1.778,-2.794 4.572,-9.144 ; -1.778,-1.524 5.842,-9.144 ; -1.778,-0.254 7.112,-9.144 ; -1.778,1.016 8.382,-9.144 ; -1.016,1.524 9.398,-8.89 9.652,-9.144 ; 0.254,1.524 9.398,-7.62 10.922,-9.144 ; 1.524,1.524 9.398,-6.35 12.192,-9.144 ; 2.794,1.524 9.398,-5.08 13.462,-9.144 ; 4.064,1.524 9.398,-3.81 14.478,-8.89 14.478,-9.144 ; 5.334,1.524 9.398,-2.54 14.478,-7.62 ; 6.604,1.524 9.398,-1.27 14.478,-6.35 ; 7.874,1.524 9.398,0 14.478,-5.08 ; 9.144,1.524 9.398,1.27 14.478,-3.81 ; 10.414,1.524 14.478,-2.54 ; 11.684,1.524 14.478,-1.27 ; 12.954,1.524 14.478,0 ; 14.224,1.524 14.478,1.27 ; 10.922,-9.144 10.922,-9.144 ; 14.478,-9.144 -1.778,-9.144 -1.778,1.524 14.478,1.524 14.478,-9.144
Info:
  text "'.Comment'" at -1.778,-10.922 h1.25
3D body: height 0.25, standoff -1.78, extent 12.446,-7.747 12.954,-7.493
3D body: height 0.25, standoff -1.78, extent 12.446,-0.127 12.954,0.127
3D body: height 0.25, standoff -1.78, extent 9.906,-0.127 10.414,0.127
3D body: height 0.25, standoff -1.78, extent 9.906,-7.747 10.414,-7.493
3D body: height 6.86, standoff 6.32, extent 10.922,-5.588 11.938,-2.032
3D body: height 6.86, standoff 6.32, extent 13.462,-5.588 14.478,-2.032
3D body: height 6.43, standoff 6.32, extent 9.398,-5.588 10.922,-2.032
3D body: height 7.62, standoff 6.32, extent 9.398,-3.302 10.922,-2.032
3D body: height 6.43, standoff 6.32, extent 11.938,-5.588 13.462,-2.032
3D body: height 7.62, standoff 6.32, extent 11.938,-3.302 13.462,-2.032
3D body: height 7.62, standoff 6.32, extent 6.858,-3.302 8.382,-2.032
3D body: height 6.43, standoff 6.32, extent 6.858,-5.588 8.382,-2.032
3D body: height 7.62, standoff 6.32, extent 4.318,-3.302 5.842,-2.032
3D body: height 6.43, standoff 6.32, extent 4.318,-5.588 5.842,-2.032
3D body: height 7.62, standoff 6.32, extent 1.778,-3.302 3.302,-2.032
3D body: height 6.43, standoff 6.32, extent 1.778,-5.588 3.302,-2.032
3D body: height 6.43, standoff 6.32, extent -0.762,-5.588 0.762,-2.032
3D body: height 6.86, standoff 6.32, extent 8.382,-5.588 9.398,-2.032
3D body: height 6.86, standoff 6.32, extent 5.842,-5.588 6.858,-2.032
3D body: height 6.86, standoff 6.32, extent 3.302,-5.588 4.318,-2.032
3D body: height 6.86, standoff 0.25, extent -1.778,-9.144 14.478,-5.588
3D body: height 6.86, standoff 0.25, extent -1.778,-2.032 14.478,1.524
3D body: height 6.35, standoff 0, extent -1.778,-9.144 14.478,1.524
3D body: height 0.25, standoff -1.78, extent -0.254,-7.747 0.254,-7.493
3D body: height 0.25, standoff -1.78, extent 2.286,-7.747 2.794,-7.493
3D body: height 0.25, standoff -1.78, extent 4.826,-7.747 5.334,-7.493
3D body: height 0.25, standoff -1.78, extent -0.254,-0.127 0.254,0.127
3D body: height 0.25, standoff -1.78, extent 2.286,-0.127 2.794,0.127
3D body: height 0.25, standoff -1.78, extent 4.826,-0.127 5.334,0.127
3D body: height 0.25, standoff -1.78, extent 7.366,-0.127 7.874,0.127
3D body: height 0.25, standoff -1.78, extent 7.366,-7.747 7.874,-7.493
3D body: height 6.86, standoff 6.32, extent -1.524,-5.588 -0.762,-2.032
3D body: height 6.86, standoff 6.32, extent 0.762,-5.588 1.778,-2.032
3D body: height 7.62, standoff 6.32, extent -0.762,-3.302 0.762,-2.032

## DIP_SW8 [mm]
pads (16):
  oval 1.6x2.4 hole 0.8: 1(0,0) 2(2.54,0) 3(5.08,0) 4(7.62,0) 5(10.16,0) 6(12.7,0) 7(15.24,0) 8(17.78,0) 9(17.78,-7.62) 10(15.24,-7.62) 11(12.7,-7.62) 12(10.16,-7.62) 13(7.62,-7.62) 14(5.08,-7.62) 15(2.54,-7.62) 16(0,-7.62)
Top Overlay:
  lines w0.25: -1.524,-9.144 -1.524,1.524 19.304,1.524 19.304,-1.143 19.304,-6.477 19.304,-9.144 -1.524,-9.144
  text "ON" at -4.318,0 h1.27
  text "DIP_SW8" at 4.826,-4.318 h1.27
Draw:
  lines w0.25: -1.778,-7.874 -0.508,-9.144 ; -1.778,-6.604 0.762,-9.144 ; -1.778,-5.334 2.032,-9.144 ; -1.778,-4.064 3.302,-9.144 ; -1.778,-2.794 4.572,-9.144 ; -1.778,-1.524 5.842,-9.144 ; -1.778,-0.254 7.112,-9.144 ; -1.778,1.016 8.382,-9.144 ; -1.016,1.524 9.398,-8.89 9.652,-9.144 ; 0.254,1.524 9.398,-7.62 10.922,-9.144 ; 1.524,1.524 9.398,-6.35 12.192,-9.144 ; 2.794,1.524 9.398,-5.08 13.462,-9.144 ; 4.064,1.524 9.398,-3.81 14.605,-9.017 ; 5.334,1.524 9.398,-2.54 16.002,-9.144 ; 6.604,1.524 9.398,-1.27 17.272,-9.144 17.78,-9.144 ; 7.874,1.524 9.398,0 18.542,-9.144 ; 9.144,1.524 9.398,1.27 19.558,-8.89 ; 10.414,1.524 19.558,-7.62 ; 11.684,1.524 19.558,-6.35 ; 12.954,1.524 19.558,-5.08 ; 14.224,1.524 19.558,-3.81 19.558,-9.144 14.478,-9.144 -1.778,-9.144 -1.778,1.524 19.558,1.524 19.558,-4.064 ; 15.494,1.524 19.558,-2.54 ; 16.764,1.524 19.558,-1.27 ; 18.034,1.524 19.558,0 ; 19.304,1.524 19.558,1.27 ; 10.922,-9.144 10.922,-9.144
Info:
  text "'.Comment'" at -1.778,-10.922 h1.25
3D body: height 6.86, standoff 6.32, extent 18.542,-5.588 19.558,-2.032
3D body: height 6.86, standoff 6.32, extent 16.002,-5.588 17.018,-2.032
3D body: height 6.43, standoff 6.32, extent 17.018,-5.588 18.542,-2.032
3D body: height 7.62, standoff 6.32, extent 17.018,-3.302 18.542,-2.032
3D body: height 6.43, standoff 6.32, extent 14.478,-5.588 16.002,-2.032
3D body: height 7.62, standoff 6.32, extent 14.478,-3.302 16.002,-2.032
3D body: height 7.62, standoff 6.32, extent -0.762,-3.302 0.762,-2.032
3D body: height 6.86, standoff 6.32, extent 0.762,-5.588 1.778,-2.032
3D body: height 6.86, standoff 6.32, extent -1.524,-5.588 -0.762,-2.032
3D body: height 0.25, standoff -1.78, extent 7.366,-7.747 7.874,-7.493
3D body: height 0.25, standoff -1.78, extent 7.366,-0.127 7.874,0.127
3D body: height 0.25, standoff -1.78, extent 4.826,-0.127 5.334,0.127
3D body: height 0.25, standoff -1.78, extent 2.286,-0.127 2.794,0.127
3D body: height 0.25, standoff -1.78, extent -0.254,-0.127 0.254,0.127
3D body: height 0.25, standoff -1.78, extent 4.826,-7.747 5.334,-7.493
3D body: height 0.25, standoff -1.78, extent 2.286,-7.747 2.794,-7.493
3D body: height 0.25, standoff -1.78, extent -0.254,-7.747 0.254,-7.493
3D body: height 6.35, standoff 0, extent -1.778,-9.144 19.558,1.524
3D body: height 6.86, standoff 0.25, extent -1.778,-2.032 19.558,1.524
3D body: height 6.86, standoff 0.25, extent -1.778,-9.144 19.558,-5.588
3D body: height 6.86, standoff 6.32, extent 3.302,-5.588 4.318,-2.032
3D body: height 6.86, standoff 6.32, extent 5.842,-5.588 6.858,-2.032
3D body: height 6.86, standoff 6.32, extent 8.382,-5.588 9.398,-2.032
3D body: height 6.43, standoff 6.32, extent -0.762,-5.588 0.762,-2.032
3D body: height 6.43, standoff 6.32, extent 1.778,-5.588 3.302,-2.032
3D body: height 7.62, standoff 6.32, extent 1.778,-3.302 3.302,-2.032
3D body: height 6.43, standoff 6.32, extent 4.318,-5.588 5.842,-2.032
3D body: height 7.62, standoff 6.32, extent 4.318,-3.302 5.842,-2.032
3D body: height 6.43, standoff 6.32, extent 6.858,-5.588 8.382,-2.032
3D body: height 7.62, standoff 6.32, extent 6.858,-3.302 8.382,-2.032
3D body: height 7.62, standoff 6.32, extent 11.938,-3.302 13.462,-2.032
3D body: height 6.43, standoff 6.32, extent 11.938,-5.588 13.462,-2.032
3D body: height 7.62, standoff 6.32, extent 9.398,-3.302 10.922,-2.032
3D body: height 6.43, standoff 6.32, extent 9.398,-5.588 10.922,-2.032
3D body: height 6.86, standoff 6.32, extent 13.462,-5.588 14.478,-2.032
3D body: height 6.86, standoff 6.32, extent 10.922,-5.588 11.938,-2.032
3D body: height 0.25, standoff -1.78, extent 9.906,-7.747 10.414,-7.493
3D body: height 0.25, standoff -1.78, extent 9.906,-0.127 10.414,0.127
3D body: height 0.25, standoff -1.78, extent 12.446,-0.127 12.954,0.127
3D body: height 0.25, standoff -1.78, extent 12.446,-7.747 12.954,-7.493
3D body: height 0.25, standoff -1.78, extent 14.986,-0.127 15.494,0.127
3D body: height 0.25, standoff -1.78, extent 17.526,-0.127 18.034,0.127
3D body: height 0.25, standoff -1.78, extent 17.526,-7.747 18.034,-7.493
3D body: height 0.25, standoff -1.78, extent 14.986,-7.747 15.494,-7.493

## DPAK-123 [mm] "TO-252"
pads (3):
  rect 1.8x0.95 smd: 1(0,0) 3(0,-4.56)
  rect 7x6.8 smd: 2(6.3,-2.28)
Top Overlay:
  lines w0.25: -0.073,-5.582 2.34,-5.582 ; -0.073,1.022 2.34,1.022
  text "DPAK" at 1.205,-0.253 h1
Draw:
  lines w0.25: -0.073,-4.566 0.943,-5.582 ; -0.073,-3.55 1.959,-5.582 ; -0.073,-2.534 2.975,-5.582 ; -0.073,-1.518 3.991,-5.582 ; -0.073,-0.502 5.007,-5.582 ; -0.073,0.514 6.023,-5.582 ; 0.435,1.022 7.039,-5.582 ; 1.451,1.022 8.055,-5.582 ; 2.467,1.022 9.071,-5.582 ; 3.483,1.022 9.706,-5.201 ; 4.499,1.022 9.706,-4.185 ; 5.515,1.022 9.706,-3.169 ; 6.531,1.022 9.706,-2.153 ; 7.547,1.022 9.706,-1.137 ; 8.563,1.022 9.706,-0.121 ; -0.073,-5.582 -0.073,1.022 9.706,1.022 9.706,-5.582 -0.073,-5.582
Info:
  text "'.Comment'" at 0.304,-7.254 h1
3D body "DPAK228P975X230-3N.step": height 2.3, standoff 0, extent -0.2,-5.53 9.55,0.97

## DPAK-132 [mm] "TO-252"
pads (3):
  rect 1.8x0.95 smd: 1(0,0) 2(0,-4.56)
  rect 7x6.8 smd: 3(6.3,-2.28)
Top Overlay:
  lines w0.25: -0.073,-5.582 2.34,-5.582 ; -0.073,1.022 2.34,1.022
  text "DPAK" at 1.205,-0.253 h1
Draw:
  lines w0.25: -0.073,-4.566 0.943,-5.582 ; -0.073,-3.55 1.959,-5.582 ; -0.073,-2.534 2.975,-5.582 ; -0.073,-1.518 3.991,-5.582 ; -0.073,-0.502 5.007,-5.582 ; -0.073,0.514 6.023,-5.582 ; 0.435,1.022 7.039,-5.582 ; 1.451,1.022 8.055,-5.582 ; 2.467,1.022 9.071,-5.582 ; 3.483,1.022 9.706,-5.201 ; 4.499,1.022 9.706,-4.185 ; 5.515,1.022 9.706,-3.169 ; 6.531,1.022 9.706,-2.153 ; 7.547,1.022 9.706,-1.137 ; 8.563,1.022 9.706,-0.121 ; -0.073,-5.582 -0.073,1.022 9.706,1.022 9.706,-5.582 -0.073,-5.582
Info:
  text "'.Comment'" at 0.304,-7.254 h1
3D body "DPAK228P975X230-3N.step": height 2.3, standoff 0, extent -0.2,-5.53 9.55,0.97

## EC11 [mm]
pads (7):
  oval 2.2x3.5 hole 1.4: 1(0,0) 2(2.5,0) 3(5,0) 4(0,14.5) 5(5,14.5)
  oval 4.5x7 hole 3: ""(-3.5,7.5) ""(8.5,7.5)
Top Overlay:
  lines w0.2: -3.7,3.4 -3.7,1.3 -1.5,1.3 ; 6.5,1.3 8.7,1.3 8.7,3.4
  lines w0.25: -3.7,11.5 -3.7,13.7 -2,13.7 ; 7,13.7 8.7,13.7 8.7,11.5
  text "EC11" at 0.126,6.75 h1.5
Draw:
  lines w0.2: -3.7,2.5 -2.7,1.5 ; -3.7,3.5 -1.7,1.5 ; -3.7,4.5 -0.7,1.5 ; -3.7,5.5 0.3,1.5 ; -3.7,6.5 1.3,1.5 ; -3.7,7.5 2.3,1.5 ; -3.7,8.5 3.3,1.5 ; -3.7,9.5 4.3,1.5 ; -3.7,10.5 5.3,1.5 ; -3.7,11.5 6.3,1.5 ; -3.7,12.5 7.3,1.5 ; -2.7,13.5 9,1.8 ; -1.7,13.5 9,2.8 ; -0.7,13.5 9,3.8 ; 0.3,13.5 9,4.8 ; 1.3,13.5 9,5.8 ; 2.3,13.5 9,6.8 ; 3.3,13.5 9,7.8 ; 4.3,13.5 9,8.8 ; 5.3,13.5 9,9.8 ; 6.3,13.5 9,10.8 ; 7.3,13.5 9,11.8 ; 8.3,1.5 -3.7,13.5 ; 8.3,13.5 9,12.8 ; -3.7,13.5 9,13.5 9,1.5 -3.7,1.5 -3.7,13.5
Info:
  text "'.Comment'" at -3.873,-3.975 h1.5
3D body "EC11-THT-15K-thread-green.step": height 19.5, standoff -3.5, extent -3.7,-0.2 8.7,14.7

## EVM3 [mm]
pads (3):
  rect 1.2x1.2 smd: 1(0,0) 3(2.2,0)
  rect 1.6x1.6 smd: 2(1.1,3.5)
Top Overlay:
  lines w0.2: -0.6,0.9 -0.6,3.5 0,3.5 ; 0.9,0 1.3,0 ; 2.2,3.5 2.8,3.5 2.8,0.9
Draw:
  lines w0.2: -0.7,0.6 0.125,-0.225 ; -0.7,1.4 0.95,-0.25 1.3,-0.25 ; -0.7,2.2 1.75,-0.25 2,-0.25 ; -0.7,3 2.55,-0.25 ; -0.6,3.7 2.9,0.2 ; 0.2,3.7 2.9,1 2.9,0.2 ; 1,3.7 2.9,1.8 2.9,1.2 ; 1.9,3.7 2.9,2.7 2.9,2.1 ; 2.9,-0.25 -0.7,-0.25 -0.7,3.75 2.9,3.75 2.9,-0.25 ; 2.9,-0.25 2.9,0.2
Info:
  text "'.Comment'" at -0.981,-1.435 h0.5

## FUSE-5x22.5MM [mm]
pads (2):
  oval 2.4x4 hole 1.5: 1(0,0) 2(22.5,0)
Top Overlay:
  lines w0.25: 2.5,0 20,0 ; -2,-4.5 24.5,-4.5 24.5,4.5 -2,4.5 -2,-4.5 ; 6,-2 6,2 16.5,2 16.5,-2 6,-2
Draw:
  lines w0.25: -2,-2.75 -0.25,-4.5 ; -2,-1 1.5,-4.5 ; -2,0.75 3.25,-4.5 ; -2,2.5 5,-4.5 ; -2,4.25 6.75,-4.5 ; -0.5,4.5 8.5,-4.5 ; 1.25,4.5 10.25,-4.5 ; 3.25,4.5 12.25,-4.5 ; 5,4.5 14,-4.5 ; 6.75,4.5 15.75,-4.5 ; 8.5,4.5 17.5,-4.5 ; 10.25,4.5 19.25,-4.5 ; 12,4.5 21,-4.5 ; 13.75,4.5 22.75,-4.5 ; 15.5,4.5 24.5,-4.5 ; 17.25,4.5 24.5,-2.75 ; 19,4.5 24.5,-1 ; 20.75,4.5 24.5,0.75 ; 22.5,4.5 24.5,2.5 ; 24.5,-4.5 -2,-4.5 -2,4.5 24.5,4.5 24.5,-4.5
Info:
  text "'.Comment'" at -1.778,-7.366 h2

## HC-49 [mm]
pads (2):
  round 1.5 hole 0.7: 1(0,0) 2(4.5,0)
Top Overlay:
  lines w0.25: -0.529,-1.699 5.084,-1.699 ; -0.504,-1.7 cw(c-0.504,0) -0.504,1.7 ; -0.479,1.699 5.109,1.699 ; 5.084,-1.7 ccw(c5.084,0) 5.084,1.7
Draw:
  lines w0.25: -1.774,-0.508 -1.012,-1.27 ; -1.774,0.508 0.004,-1.27 ; -1.266,1.016 1.02,-1.27 ; -0.504,-1.778 5.084,-1.778 ; -0.504,1.27 2.036,-1.27 ; -0.504,1.778 5.084,1.778 ; -0.504,1.779 ccw(c-0.504,0) -0.479,-1.779 ; 0.512,1.27 3.052,-1.27 ; 1.528,1.27 4.068,-1.27 ; 2.544,1.27 5.084,-1.27 ; 3.56,1.27 5.846,-1.016 ; 4.576,1.27 6.354,-0.508 ; 5.059,1.779 cw(c5.084,0) 5.084,-1.779 ; 5.592,1.27 6.354,0.508
Info:
  text "'.Comment'" at -1.778,-2.794 h0.75
3D body: height 0.25, standoff -1.78, extent 4.246,-0.254 4.754,0.254
3D body: height 0.25, standoff -1.78, extent -0.254,-0.254 0.254,0.254
3D body: height 2.26, standoff 0.23, extent 3.687,-1.27 6.227,1.27
3D body: height 0.25, standoff 0, extent 3.433,-1.651 6.735,1.651
3D body: height 0.25, standoff 0, extent -2.155,-1.651 1.147,1.651
3D body: height 2.26, standoff 0.23, extent -1.647,-1.27 0.893,1.27
3D body: height 2.26, standoff 0.23, extent -0.382,-1.268 4.952,1.267
3D body: height 0.25, standoff 0, extent -0.377,-1.651 4.957,1.651

## HC-49SM [mm]
pads (2):
  rect 4x1.2 smd: 1(0,0) 2(9.4,0)
Top Overlay:
  lines w0.25: -0.7,-0.95 -0.7,-1.9 10.1,-1.9 10.1,-0.95 ; -0.7,0.95 -0.7,1.9 10.1,1.9 10.1,0.95 ; 2.6,0 3.7,0 ; 3.7,-1.4 3.7,0 ; 3.7,1.4 3.7,0 ; 5.7,-1.4 5.7,0 ; 5.7,1.4 5.7,0 ; 6.8,0 5.7,0 ; 4.2,-1.4 5.2,-1.4 5.2,1.4 4.2,1.4 4.2,-1.4
Draw:
  lines w0.25: -0.6,-0.9 0.2,-1.7 ; -0.241,1.759 3.2,-1.7 ; 1.259,1.759 4.7,-1.7 ; 1.7,-1.7 -0.6,0.6 ; 2.759,1.759 6.2,-1.7 ; 4.259,1.759 7.7,-1.7 ; 5.759,1.759 9.2,-1.7 ; 7.2,1.8 10,-1 10,-1.3 ; 8.7,1.8 10,0.5 10,0 ; -0.6,0.6 -0.6,0.6 ; -0.6,-1.7 -0.6,1.8 10,1.8 10,-1.7 -0.6,-1.7
Info:
  text "'.Comment'" at -0.6,-3.4 h1
3D body: height 0.1, standoff 0, extent 7.1,-0.5 11.1,0.5
3D body: height 0.1, standoff 0, extent -1.7,-0.5 2.3,0.5
3D body: height 3.5, standoff 0.1, extent -0.2,-1.7 9.6,1.7
3D body: height 0.6, standoff 0.1, extent -0.45,-1.9 9.85,1.9
3D body: height 0.3, standoff 0.05, extent -0.6,-2 10,2